# Altium footprint library Lib_Global.PcbLib: 96 footprints (part 4 of 6)
Each footprint in its own frame and in the unit in brackets; x right, y up, seen from the top. Pads: shape width x height; smd on the part's side, far side on the other; paste and mask are expansions set on the pad; w line width, h text height; cw(c..) or ccw(c..) is an arc to the next point about the centre after c.
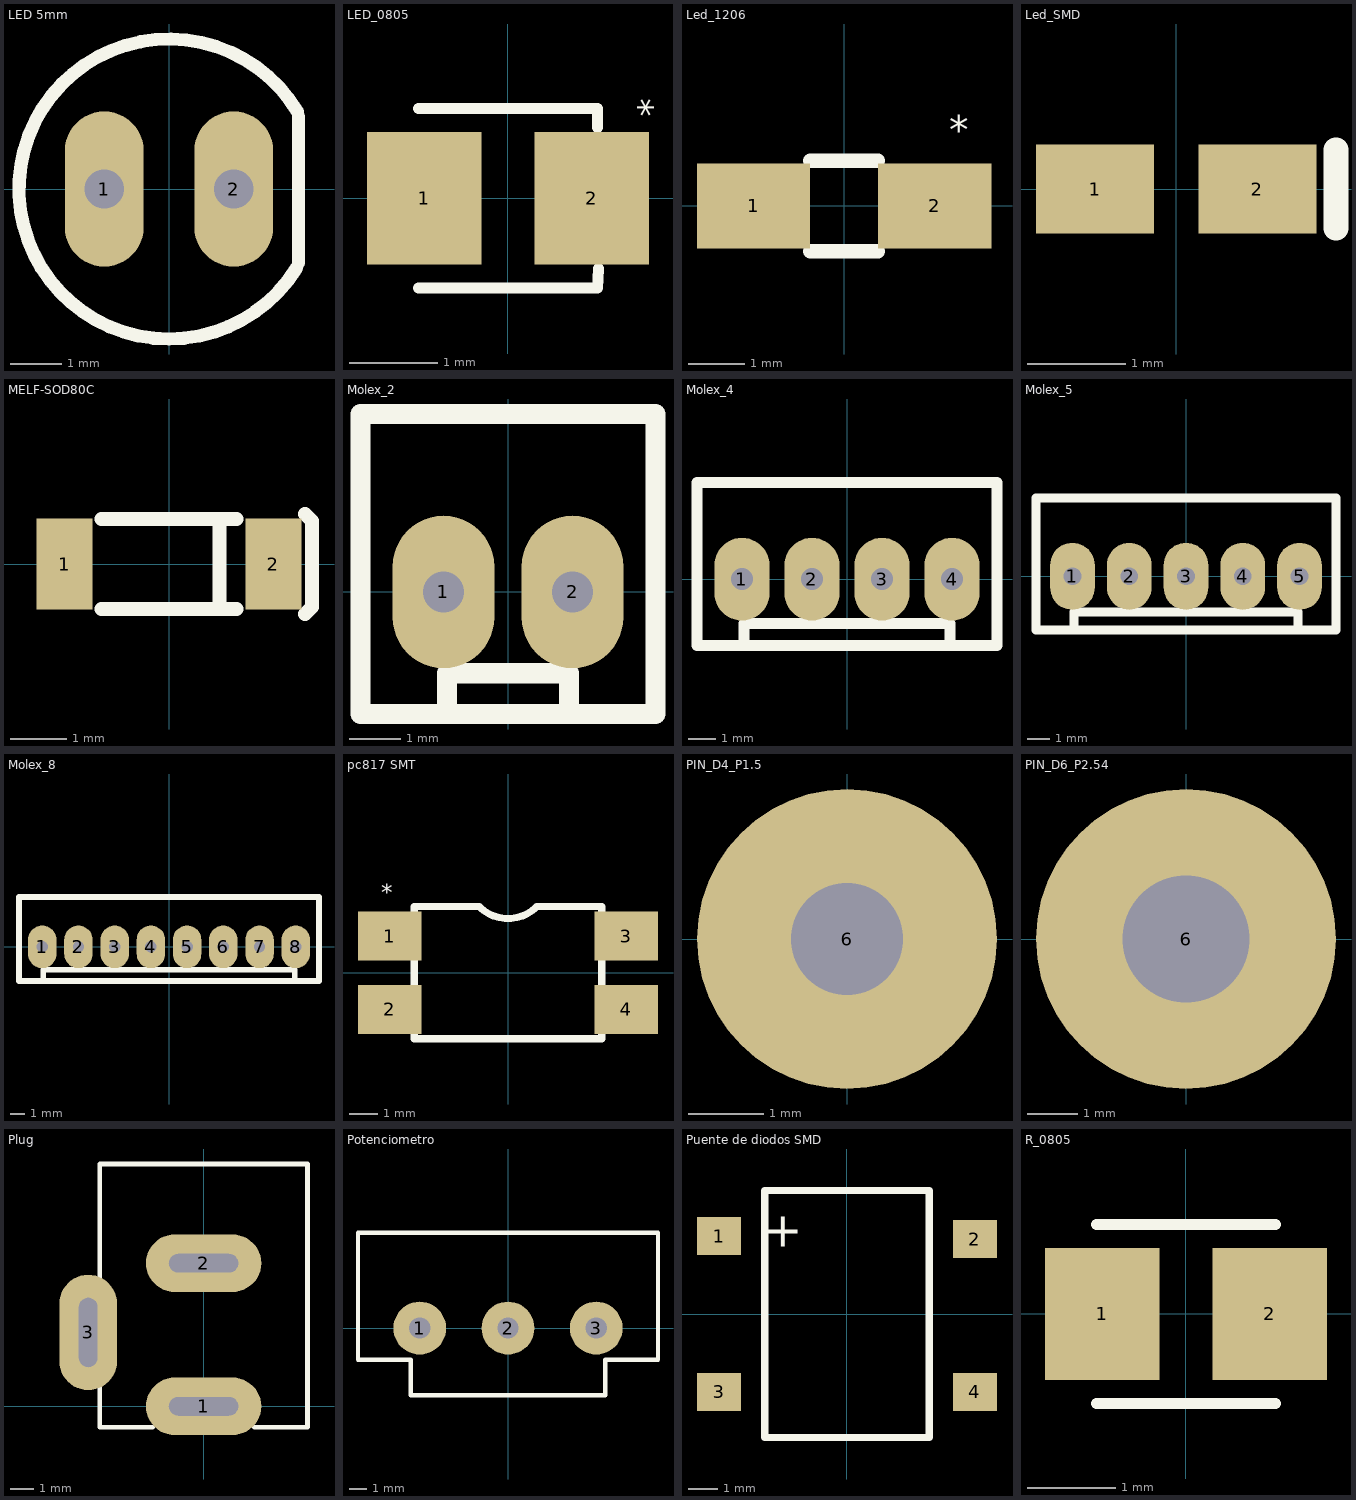
[diagram p3: the footprints below, top view; thin cyan lines are the x and y axes]

## LED 5mm [mm]
pads (2):
  oval 1.524x3 hole 0.762: 1(-1.25,0) 2(1.25,0)
Top Overlay:
  lines w0.254: 2.462,-1.524 cw(c0,0) 2.483,1.49 ; 2.5,-1.425 2.5,1.4
3D body "User Library-LED 5MM-1.sldprt": height 9.13, standoff -19.57, extent -2.975,-2.973 2.64,2.973

## LED_0805 [mm]
pads (2):
  rect 1.3x1.5 smd: 1(-0.95,0) 2(0.95,0)
Top Overlay:
  lines w0.127: -1.016,-1.016 1.016,-1.016 1.025,-0.8 ; -1.016,1.016 1.016,1.016 1.016,0.8
  text "*" at 1.35,0.925 h0.3
3D body "everlight-17-21-0805LED-GREEN.SLDPRT": height 1.1, standoff -0.01, extent -1,-0.625 1,0.625

## Led_1206 [mm]
pads (2):
  rect 2x1.5 smd: 1(-1.6,0) 2(1.6,0)
Top Overlay:
  lines w0.25: -0.6,-0.8 0.6,-0.8 ; -0.6,0.8 0.6,0.8
  text "*" at 2.2,1.1 h0.5
3D body "User Library-LED 1206 RED.sldprt": height 1.1, standoff 0, extent -1.6,-0.8 1.6,0.8

## Led_SMD [mm]
pads (2):
  rect 1.2x0.9 smd: 1(-0.825,0) 2(0.825,0)
Top Overlay:
  lines w0.25: 1.625,-0.4 1.625,0.4

## MELF-SOD80C [mm]
pads (2):
  rect 1x1.62 smd: 1(-1.855,0) 2(1.855,0)
Top Overlay:
  lines w0.25: -1.2,-0.8 1.2,-0.8 ; -1.2,0.8 1.2,0.8 ; 0.9,-0.8 0.9,0.8 ; 2.413,-0.889 2.54,-0.762 2.54,0.762 2.413,0.889
3D body "User Library-melf-2.sldprt": height 1.6, standoff 0.01, extent -1.855,-0.798 1.845,0.798

## Molex_2 [mm]
pads (2):
  oval 2x3 hole 0.8: 1(-1.27,0) 2(1.27,0)
Top Overlay:
  lines w0.4: -1.2,-2.4 -1.2,-1.6 1.2,-1.6 1.2,-2.4 ; -2.9,-2.4 2.9,-2.4 2.9,3.5 -2.9,3.5 -2.9,-2.4

## Molex_4 [mm]
pads (4):
  oval 2x3 hole 0.8: 1(-3.81,0) 2(-1.27,0) 3(1.27,0) 4(3.81,0)
Top Overlay:
  lines w0.4: -3.74,-2.4 -3.74,-1.6 3.74,-1.6 3.74,-2.4 ; -5.44,-2.4 -5.44,3.5 5.44,3.5 5.44,-2.4 -5.44,-2.4

## Molex_5 [mm]
pads (5):
  oval 2x3 hole 0.8: 1(-5.08,0) 2(-2.54,0) 3(0,0) 4(2.54,0) 5(5.08,0)
Top Overlay:
  lines w0.4: -5.01,-2.4 -5.01,-1.6 5.01,-1.6 5.01,-2.4 ; -6.71,-2.4 -6.71,3.5 6.71,3.5 6.71,-2.4 -6.71,-2.4

## Molex_8 [mm]
pads (8):
  oval 2x3 hole 0.8: 1(-8.89,0) 2(-6.35,0) 3(-3.81,0) 4(-1.27,0) 5(1.27,0) 6(3.81,0) 7(6.35,0) 8(8.89,0)
Top Overlay:
  lines w0.4: -8.82,-2.4 -8.82,-1.6 8.82,-1.6 8.82,-2.4 ; -10.52,-2.4 10.52,-2.4 10.52,3.5 -10.52,3.5 -10.52,-2.4

## pc817 SMT [mm]
pads (4):
  rect 2.2x1.7 smd: 1(-4.1,1.27) 2(-4.1,-1.27) 3(4.1,1.27) 4(4.1,-1.27)
Top Overlay:
  lines w0.25: -3.25,-2.29 3.25,-2.29 3.25,2.29 1,2.29 cw(c0,3.29) -1,2.29 -3.25,2.29 -3.25,-2.29
  text "*" at -4,2.29 h1

## PIN_D4_P1.5 [mm]
pads (1):
  round 4 hole 1.5: 6(0,0)

## PIN_D6_P2.54 [mm]
pads (1):
  round 6 hole 2.54: 6(0,0)

## Plug [mm]
pads (3):
  oval 5x2.5 hole 3 slot 0.8 at 90 deg: 1(0,0) 2(0,6.2)
  oval 2.5x5 hole 0.8 slot 3 at 90 deg: 3(-5,3.2)
Top Overlay:
  lines w0.2: -4.5,1 -4.5,-0.9 -2.2,-0.9 ; -4.5,5.4 -4.5,10.5 4.5,10.5 4.5,-0.9 2.2,-0.9
Mechanical 1:
3D body: height 0.25, standoff 0, extent 0.725,5.85 0.725,5.85
3D body "User Library-3066-31000001R-Rev_01.sldprt": height 10.7, standoff -3.9, extent -5.05,0 4.5,14.5

## Potenciometro [mm]
pads (3):
  round 3 hole 1.2: 1(-5,0) 2(0,0) 3(5,0)
Top Overlay:
  lines w0.25: -8.5,-1.8 -8.5,5.4 8.5,5.4 8.5,-1.8 5.5,-1.8 5.5,-3.8 -5.5,-3.8 -5.5,-1.8 -8.5,-1.8
3D body "User Library-TrimPot.sldprt": height 21.3, standoff -3.9, extent -8.5,-18.425 8.499,5.775

## Puente de diodos SMD [mm]
pads (4):
  rect 1.5x1.3 smd: 1(-4.35,2.65) 2(4.35,2.55) 3(-4.35,-2.65) 4(4.35,-2.65)
Top Overlay:
  lines w0.25: -2.8,-4.2 -2.8,4.2 2.8,4.2 2.8,-4.2 -2.8,-4.2
  text "+" at -1.5,1.9 h2

## R_0805 [mm]
pads (2):
  rect 1.3x1.5 smd: 1(-0.95,0) 2(0.95,0)
Top Overlay:
  lines w0.127: -1.016,-1.016 1.016,-1.016 ; -1.016,1.016 1.016,1.016
3D body: height 0.25, standoff 0, extent 1.8,-1.2 1.8,-1.2
3D body "User Library-RES_2013-0805.sldprt": height 0.76, standoff 0, extent -1.15,-0.675 1.15,0.675